# Altium footprint library WL_RFFC.PcbLib: 42 footprints (part 3 of 3)
Each footprint in its own frame and in the unit in brackets; x right, y up, seen from the top. Pads: shape width x height; smd on the part's side, far side on the other; paste and mask are expansions set on the pad; w line width, h text height; cw(c..) or ccw(c..) is an arc to the next point about the centre after c.
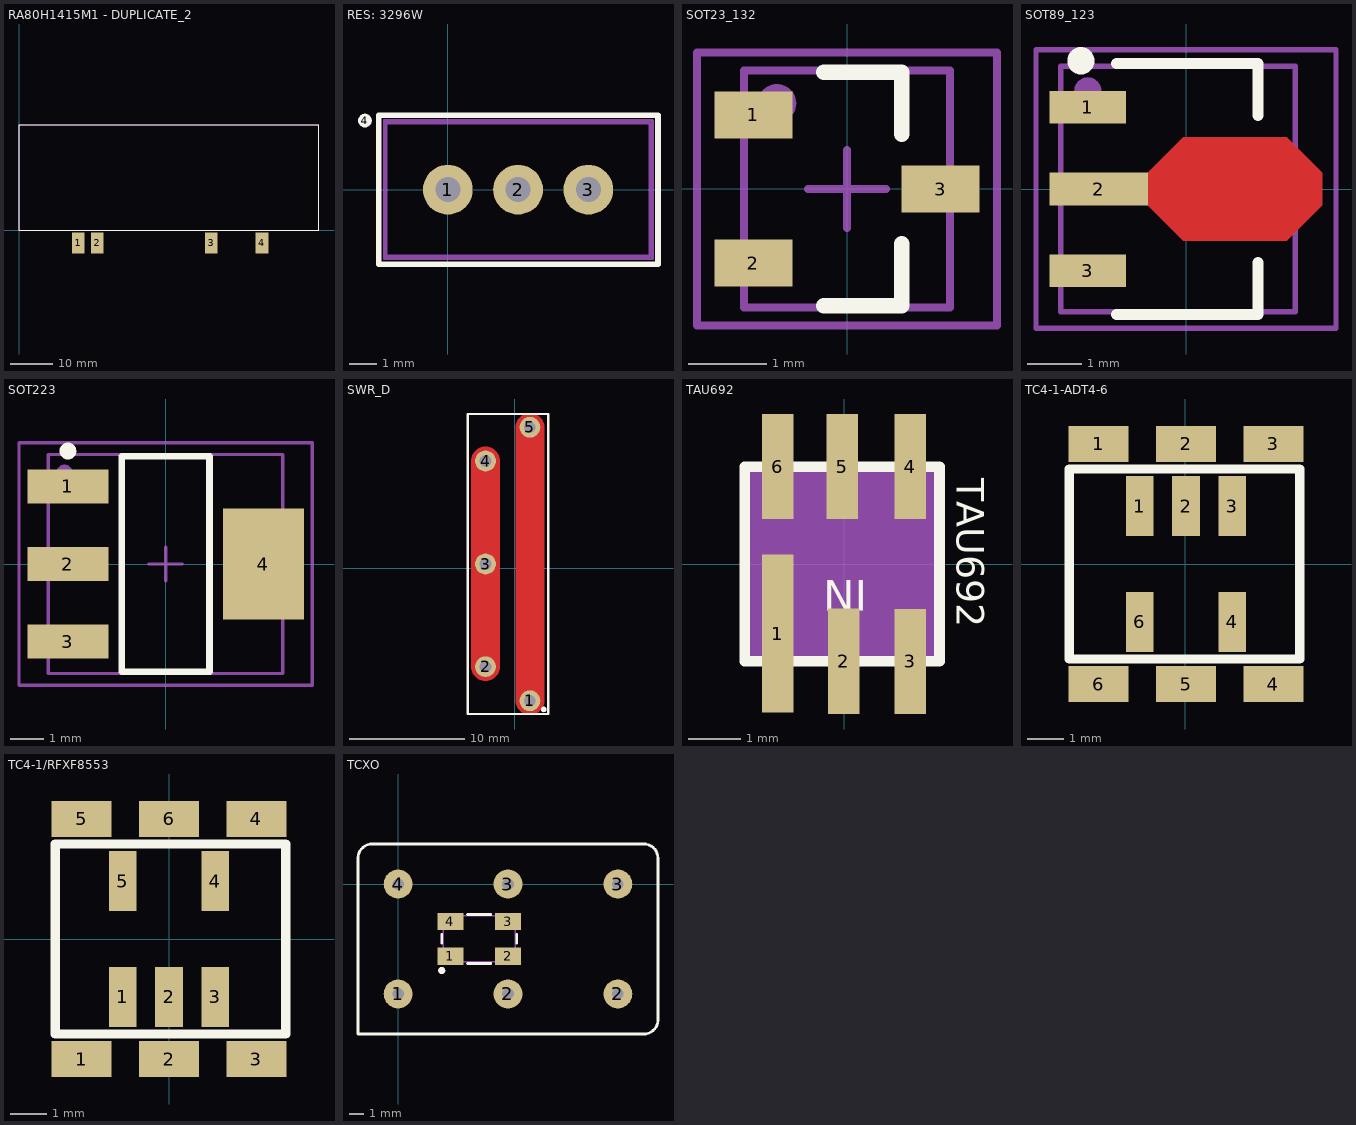
[diagram p2: the footprints below, top view; thin cyan lines are the x and y axes]

## RA80H1415M1 - DUPLICATE_2 [mm]
pads (4):
  rect 3x5 smd: 1(14,-3) 2(18.5,-3) 3(45.5,-3) 4(57.5,-3)
Top Overlay:
  lines w0.2: 0,0 71,0 71,25 0,25 0,0
Mechanical 15:
  lines w0.2: 0,0 0,25 71,25 71,0 0,0

## RES: 3296W [mm]
pads (4):
  round 1.8 hole 0.9: 1(0,0) 2(2.54,0) 3(5.08,0)
  round 0.5 on Top Overlay: 4(-3,2.5)
Top Overlay:
  lines w0.2: -2.5,-2.7 7.6,-2.7 7.6,2.7 -2.5,2.7 -2.5,-2.7
Mechanical 1:
  lines w0.1: -2.225,-2.4 7.305,-2.4 7.305,2.4 -2.225,2.4 -2.225,-2.4
Mechanical 15:
  lines w0.1: -2.3,-2.5 -2.3,2.5 7.4,2.5 7.4,-2.5 -2.3,-2.5
3D body "User Library-3296W.STEP": height 11.55, standoff -1.6, extent -2.225,-2.4 7.305,2.4

## SOT23_132 [mm] "SOT23, 3-Leads, Body 3,0x2,6mm (max), Pitch 0,95mm, IPC Medium Density"
height 1.1
pads (4):
  rect 1x0.6 smd: 1(-1.2,0.95) 2(-1.2,-0.95) 3(1.2,0)
  round 0.5 on Mech1: ""(-0.9,1.1)
Top Overlay:
  lines w0.2: -0.3,-1.5 0.7,-1.5 0.7,-0.7 ; -0.3,1.5 0.7,1.5 0.7,0.7
Mechanical 1:
  lines w0.1: -1.32,-1.52 -1.32,1.52 1.32,1.52 1.32,-1.52 -1.32,-1.52
Mechanical 15:
  lines w0.1: -0.5,0 0.5,0 ; 0,-0.5 0,0.5 ; -1.925,-1.75 1.925,-1.75 1.925,1.75 -1.925,1.75 -1.925,-1.75
3D body "SOT95P237X112-3N.step": height 1.12, standoff 0, extent -1.32,-1.52 1.32,1.52

## SOT89_123 [mm] "SOT89, 3-Leads, Body 4,50x2,45mm, Pitch 1,50mm, Lead Span 4,1mm, IPC Medium Density"
height 1.6
pads (4):
  rect 1.4x0.6 smd: 1(-1.8,1.5) 3(-1.8,-1.5)
  rect 1.8x0.6 smd: 2(-1.6,0)
  round 0.5 on Mech1: ""(-1.8,1.8)
Top Layer:
  region: -0.8,0.2 -0.05,0.95 1.85,0.95 2.5,0.3 2.5,-0.3 1.85,-0.95 -0.05,-0.95 -0.8,-0.2
Top Overlay:
  circle w0.25: c-1.927,2.35 r0.125
  lines w0.2: -1.278,-2.3 1.322,-2.3 1.322,-1.35 ; -1.278,2.3 1.322,2.3 1.322,1.35
Mechanical 1:
  lines w0.1: -2.3,-2.25 -2.3,2.25 2,2.25 2,-2.25 -2.3,-2.25
Mechanical 15:
  lines w0.1: -0.477,0 0.523,0 ; 0.022,-0.5 0.022,0.5 ; -2.75,-2.55 2.75,-2.55 2.75,2.55 -2.75,2.55 -2.75,-2.55
3D body "SOT-89.step": height 1.51, standoff 0, extent -2.3,-2.25 2,2.25

## SOT223 [mm] "SOT223, 4-Leads, Body 6,50x7,00mm (avg), Pitch 2,30mm, IPC Medium Density"
height 1.8
pads (5):
  rect 2.4x1 smd: 1(-2.9,2.3) 2(-2.9,0) 3(-2.9,-2.3)
  rect 2.4x3.3 smd: 4(2.9,0)
  round 0.5 on Mech1: ""(-3,2.7)
Top Overlay:
  circle w0.25: c-2.9,3.35 r0.125
  lines w0.2: -1.3,-3.2 -1.3,3.2 1.3,3.2 1.3,-3.2 -1.3,-3.2
Mechanical 1:
  lines w0.1: -3.48,-3.25 3.48,-3.25 3.48,3.25 -3.48,3.25 -3.48,-3.25
Mechanical 15:
  lines w0.1: -0.5,0 0.5,0 ; 0,-0.5 0,0.5 ; -4.35,-3.6 -4.35,3.6 4.35,3.6 4.35,-3.6 -4.35,-3.6
3D body "SOT-223-3.step": height 1.65, standoff -0.03, extent -3.48,-3.25 3.48,3.25

## SWR_D [mm]
pads (6):
  round 1.8 hole 1: 1(1.325,-11.475) 2(-2.525,-8.525) 3(-2.525,0.375) 4(-2.525,9.3) 5(1.325,12.225)
  round 0.5 on Top Overlay: ""(2.525,-12.225)
Top Layer:
  lines w2.5: -2.525,-8.525 -2.525,9.3 ; 1.325,-11.475 1.325,12.225
Top Overlay:
  lines w0.2: -4.075,-12.625 -4.075,13.375 2.925,13.375 2.925,-12.625 -4.075,-12.625
Mechanical 15:
  lines w0.1: -4.075,-12.625 2.925,-12.625

## TAU692 [mm]
pads (6):
  rect 0.6x3 smd: 1(-1.26,-1.324)
  rect 0.6x2 smd: 2(-0.004,-1.849) 3(1.261,-1.851) 4(1.261,1.851) 5(-0.035,1.851) 6(-1.261,1.851)
Top Overlay:
  lines w0.2: -1.886,-1.851 -1.885,1.851 1.814,1.851 1.815,-1.851 -1.886,-1.851
  text "TAU692" at 1.973,1.634 h0.9
  text "IN" at 0.438,-0.116 h1
Mechanical 1:
  rectangle: -1.884,-1.851 1.816,1.851

## TC4-1-ADT4-6 [mm]
pads (11):
  rect 1.65x1 smd: 1(-2.375,3.3) 2(0.025,3.3) 3(2.425,3.3) 4(2.425,-3.3) 5(0.025,-3.3) 6(-2.375,-3.3)
  rect 0.76x1.65 smd: 1(-1.245,1.59) 2(0.025,1.59) 3(1.295,1.59) 4(1.295,-1.59) 6(-1.245,-1.59)
Top Overlay:
  lines w0.254: -3.185,-2.61 3.155,-2.61 3.155,2.61 -3.185,2.61 -3.185,-2.61
3D body "TC1-1T.STEP": height 3.81, standoff 0, extent -1.88,-1.963 1.93,1.847

## TC4-1/RFXF8553 [mm]
pads (11):
  rect 1.65x1 smd: 1(-2.4,-3.3) 2(0,-3.3) 3(2.4,-3.3) 4(2.4,3.3) 5(-2.4,3.3) 6(0,3.3)
  rect 0.76x1.65 smd: 1(-1.27,-1.59) 2(0,-1.59) 3(1.27,-1.59) 4(1.27,1.59) 5(-1.27,1.59)
Top Overlay:
  lines w0.254: -3.13,-2.61 3.21,-2.61 3.21,2.61 -3.13,2.61 -3.13,-2.61
3D body "TC1-1T.STEP": height 3.81, standoff 0, extent -1.905,-1.847 1.905,1.963

## TCXO [mm]
pads (12):
  round 2 hole 0.8: 1(0,-7.62) 2(7.62,-7.62) 2(15.24,-7.62) 3(7.62,0) 3(15.24,0) 4(0,0)
  round 0.5 on Top Overlay: 1(3.025,-6)
  rect 1.8x1.2 smd: 1(3.625,-5) 2(7.625,-5) 3(7.625,-2.6) 4(3.625,-2.6)
  round 0.5 on Mech1: ""(3.625,-4.9)
Top Overlay:
  lines w0.2: 3.025,-4.1 3.025,-3.5 ; 4.825,-5.5 6.425,-5.5 ; 4.825,-2.1 6.425,-2.1 ; 8.225,-4.1 8.225,-3.5 ; -2.78,-10.4 17.02,-10.4 ccw(c17.03,-9.41) 18.02,-9.42 18.02,1.78 ccw(c17.02,1.78) 17.02,2.78 -1.78,2.78 ccw(c-1.79,1.79) -2.78,1.8 -2.78,-10.4
Mechanical 1:
  lines w0.1: 3.125,-5.388 8.125,-5.388 8.125,-2.213 3.125,-2.213 3.125,-5.388